# Altium footprint library ATROTECH.PcbLib: 334 footprints (part 10 of 21)
Each footprint in its own frame and in the unit in brackets; x right, y up, seen from the top. Pads: shape width x height; smd on the part's side, far side on the other; paste and mask are expansions set on the pad; w line width, h text height; cw(c..) or ccw(c..) is an arc to the next point about the centre after c.
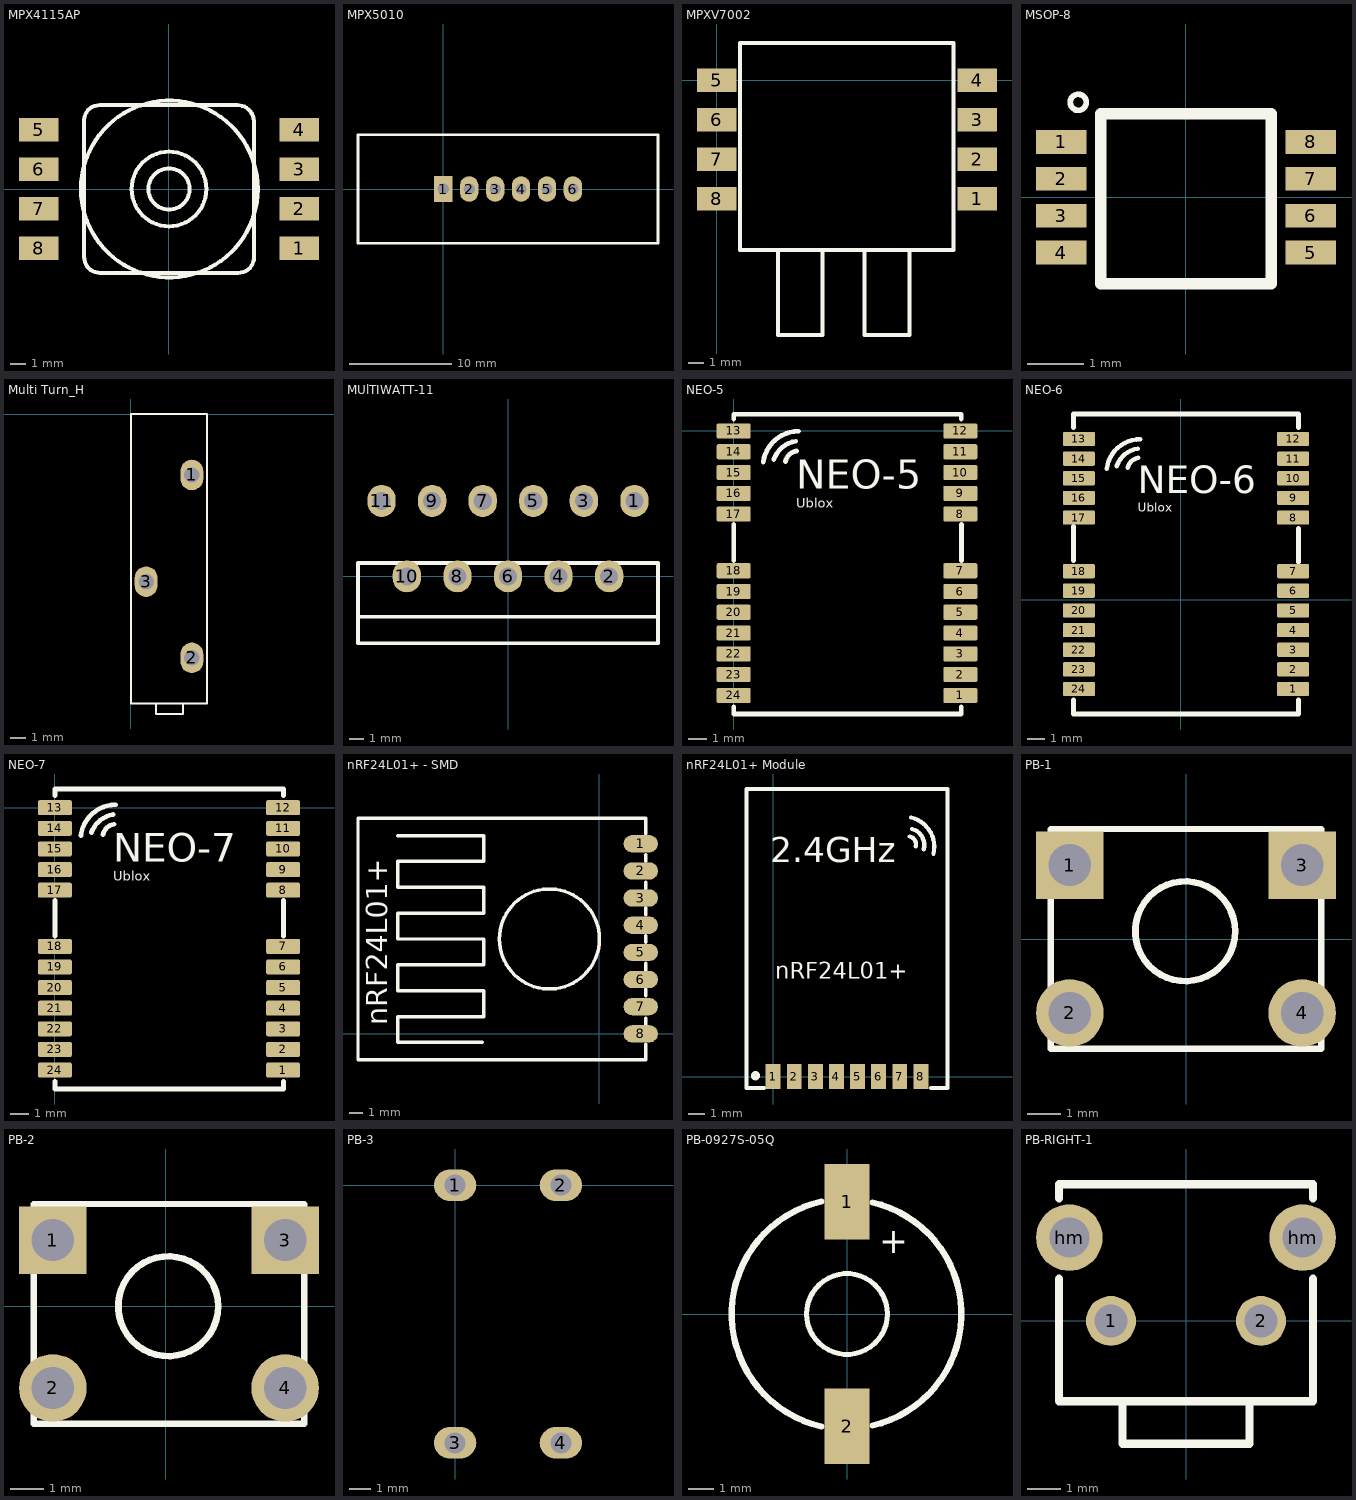
[diagram p9: the footprints below, top view; thin cyan lines are the x and y axes]

## MPX4115AP [mm]
pads (8):
  rect 2.54x1.524 smd: 1(8.38,-3.81) 2(8.38,-1.27) 3(8.38,1.27) 4(8.38,3.81) 5(-8.38,3.81) 6(-8.38,1.27) 7(-8.38,-1.27) 8(-8.38,-3.81)
Top Overlay:
  circle w0.254: c0,0 r1.326
  circle w0.254: c0,0 r2.4
  circle w0.254: c0.025,0 r5.69
  lines w0.254: -4.445,5.395 ccw(c-4.477,4.413) -5.459,4.445 -5.459,-4.381 ccw(c-4.445,-4.381) -4.445,-5.395 4.444,-5.395 ccw(c4.476,-4.413) 5.458,-4.445 ; -4.382,5.395 4.379,5.395 cw(c4.411,4.348) 5.458,4.381 5.458,-4.572

## MPX5010 [mm]
pads (6):
  rect 1.8x2.5 hole 1.1: 1(0,0)
  oval 1.8x2.5 hole 1.1: 2(2.54,0) 3(5.08,0) 4(7.62,0) 5(10.16,0) 6(12.7,0)
Top Overlay:
  lines w0.254: -8.36,-5.3 -8.36,5.3 21.04,5.3 21.04,-5.3 -8.36,-5.3

## MPXV7002 [mm]
pads (8):
  rect 2.54x1.52 smd: 1(16.76,-7.62) 2(16.76,-5.08) 3(16.76,-2.54) 4(16.76,0) 5(0,0) 6(0,-2.54) 7(0,-5.08) 8(0,-7.62)
Top Overlay:
  lines w0.254: 3.937,-10.922 3.937,-16.4 6.8,-16.4 6.8,-10.922 ; 9.5,-10.922 9.5,-16.4 12.4,-16.4 12.4,-10.922 ; 1.5,-10.922 1.5,2.4 15.24,2.4 15.24,1.27 15.24,-10.922 1.5,-10.922
3D body "MPXV7002.step": height 10.41, standoff -0.25, extent -0.522,-16.563 17.322,2.36

## MSOP-8 [mm]
pads (8):
  rect 0.889x0.42 smd: 1(-2.2,0.975) 2(-2.2,0.325) 3(-2.2,-0.325) 4(-2.2,-0.975) 5(2.2,-0.975) 6(2.2,-0.325) 7(2.2,0.325) 8(2.2,0.975)
Top Overlay:
  circle w0.1: c-1.9,1.675 r0.141
  lines w0.203: -1.5,-1.525 -1.5,1.475 1.5,1.475 1.5,-1.525 -1.5,-1.525
3D body "User Library-MSOP-8-1.step": height 0.92, standoff 0, extent -2.5,-1.525 2.5,1.475

## Multi Turn_H [mm]
pads (3):
  oval 1.5x2 hole 1: 1(4,-4) 2(4,-16) 3(1,-11)
Top Overlay:
  lines w0.127: 1.651,-19.05 1.651,-19.685 3.429,-19.685 3.429,-19.05 ; 0,-19 0,0 5,0 5,-19 0,-19

## MUlTIWATT-11 [mil]
height 760
pads (11):
  oval 75x85 hole 48: 1(335,200) 2(268,0) 3(201,200) 4(134,0) 5(67,200) 6(0,0) 7(-67,200) 8(-134,0) 9(-201,200) 10(-268,0) 11(-335,200)
Top Overlay:
  lines w10: -397.5,-117 -397.5,-115 ; -397.5,-107 397.5,-107 ; -397.5,-177.17 -397.5,35 397.5,35 397.5,-177.17 -397.5,-177.17
3D body "User Library-Multiwatt11V.step": height 858.27, standoff -125.98, extent -397.64,-179.14 397.64,210.23

## NEO-5 [mm]
pads (24):
  rrect20% 1.8x0.8 smd: 1(12,-14) 2(12,-12.9) 3(12,-11.8) 4(12,-10.7) 5(12,-9.6) 6(12,-8.5) 7(12,-7.4) 8(12,-4.4) 9(12,-3.3) 10(12,-2.2) 11(12,-1.1) 12(12,0) 13(0,0) 14(0,-1.1) 15(0,-2.2) 16(0,-3.3) 17(0,-4.4) 18(0,-7.4) 19(0,-8.5) 20(0,-9.6) 21(0,-10.7) 22(0,-11.8) 23(0,-12.9) 24(0,-14)
Top Overlay:
  lines w0.254: 0,-14.605 0,-14.986 12.047,-14.986 12.047,-14.605 ; 0,-6.858 0,-4.953 ; 0,0.635 0,0.889 12.047,0.889 12.047,0.635 ; 1.565,-1.656 cw(c3.429,-1.893) 3.429,-0.014 ; 2.127,-1.513 cw(c3.496,-1.972) 3.288,-0.542 ; 2.742,-1.617 cw(c3.427,-1.751) 3.328,-1.06 ; 12.065,-6.858 12.065,-4.953
  text "Ublox" at 3.302,-4.064 h0.5
  text "NEO-5" at 3.302,-3.048 h1.52

## NEO-6 [mm]
pads (24):
  rrect20% 1.8x0.8 smd: 1(6.3,-5) 2(6.3,-3.9) 3(6.3,-2.8) 4(6.3,-1.7) 5(6.3,-0.6) 6(6.3,0.5) 7(6.3,1.6) 8(6.3,4.6) 9(6.3,5.7) 10(6.3,6.8) 11(6.3,7.9) 12(6.3,9) 13(-5.7,9) 14(-5.7,7.9) 15(-5.7,6.8) 16(-5.7,5.7) 17(-5.7,4.6) 18(-5.7,1.6) 19(-5.7,0.5) 20(-5.7,-0.6) 21(-5.7,-1.7) 22(-5.7,-2.8) 23(-5.7,-3.9) 24(-5.7,-5)
Top Overlay:
  lines w0.254: -6,-5.605 -6,-6.4 6.6,-6.4 6.6,-5.605 ; -6,2.195 -6,4.1 ; -6,9.635 -6,10.4 6.6,10.4 6.6,9.635 ; -4.135,7.344 cw(c-2.271,7.107) -2.271,8.986 ; -3.573,7.487 cw(c-2.204,7.028) -2.412,8.458 ; -2.958,7.383 cw(c-2.273,7.249) -2.372,7.94 ; 6.6,2.095 6.6,4
  text "NEO-6" at -2.398,5.952 h1.52
  text "Ublox" at -2.398,4.936 h0.5
3D body "User Library-UBLOX_GPS_NEO-6M.step": height 2.64, standoff 0, extent -5.88,-6.3 6.48,10.3

## NEO-7 [mm]
pads (24):
  rrect20% 1.8x0.8 smd: 1(12.178,-14) 2(12.178,-12.9) 3(12.178,-11.8) 4(12.178,-10.7) 5(12.178,-9.6) 6(12.178,-8.5) 7(12.178,-7.4) 8(12.178,-4.4) 9(12.178,-3.3) 10(12.178,-2.2) 11(12.178,-1.1) 12(12.178,0) 13(0,0) 14(0,-1.1) 15(0,-2.2) 16(0,-3.3) 17(0,-4.4) 18(0,-7.4) 19(0,-8.5) 20(0,-9.6) 21(0,-10.7) 22(0,-11.8) 23(0,-12.9) 24(0,-14)
Top Overlay:
  lines w0.254: 0,-14.605 0,-15.011 12.2,-15.011 12.2,-14.605 ; 0,-6.858 0,-4.953 ; 0,0.635 0,1 12.2,1 12.2,0.635 ; 1.387,-1.478 cw(c3.251,-1.715) 3.251,0.164 ; 1.949,-1.335 cw(c3.319,-1.794) 3.111,-0.364 ; 2.564,-1.439 cw(c3.249,-1.574) 3.15,-0.882 ; 12.2,-6.858 12.2,-4.953
  text "NEO-7" at 3.124,-2.87 h1.52
  text "Ublox" at 3.124,-3.886 h0.5

## nRF24L01+ - SMD [mil]
pads (8):
  oval 100x50 smd: 1(120,551.18) 2(120,472.44) 3(120,393.7) 4(120,314.96) 5(120,236.22) 6(120,157.48) 7(120,78.74) 8(120,0)
Top Overlay:
  circle w10: c-145,275 r145
  lines w10: -585,575 -335,575 -335,500 -585,500 -585,425 -335,425 -335,350 -585,350 -585,275 -335,275 -335,200 -585,200 -585,125 -335,125 -335,50 -585,50 -585,-25 -340,-25 ; 135,-30 135,-75 125,-75 -700,-75 -700,625 135,625 135,580 ; 135,25 135,45 ; 135,110 135,130 ; 135,185 135,205 ; 135,265 135,285 ; 135,345 135,365 ; 135,420 135,440 ; 135,500 135,520
  text "nRF24L01+" at -615,25 h60

## nRF24L01+ Module [mm] "nRF24L01+ Module"
pads (8):
  rect 0.9x1.5 smd: 1(0,0) 2(1.27,0) 3(2.54,0) 4(3.81,0) 5(5.08,0) 6(6.35,0) 7(7.62,0) 8(8.89,0)
Top Overlay:
  circle w0.254: c-1.067,0.051 r0.148
  lines w0.254: -0.559,-0.686 -1.6,-0.686 -1.6,17.314 10.49,17.314 10.49,-0.686 9.5,-0.686 ; 8.23,14.453 cw(c8.115,13.983) 8.585,13.868 ; 8.306,15.596 cw(c7.887,13.83) 9.652,13.411 ; 8.357,14.91 cw(c8.103,13.945) 9.068,13.691
  text "2.4GHz" at -0.178,12.903 h1.52
  text "nRF24L01+" at 0.127,5.893 h1

## PB-1 [mil] "SHORT PUSH BUTTON"
pads (4):
  rect 80x80 hole 50: 1(-137.5,87.5) 3(137.5,87.5)
  round 80 hole 50: 2(-137.5,-87.5) 4(137.5,-87.5)
Top Overlay:
  circle w7.87: c-0.89,9.15 r59.06
  lines w7: -160,130 160,130
  lines w7.87: -160,130 -160,-130 160,-130 160,130
3D body "tactileswitch-short.STEP": height 215, standoff -113, extent -150.4,-117.29 152.4,119.21

## PB-2 [mil]
pads (4):
  rect 80x80 hole 50: 1(-133.5,78.5) 3(141.5,78.5)
  round 80 hole 50: 2(-133.5,-96.5) 4(141.5,-96.5)
Top Overlay:
  circle w7.87: c3.11,0.15 r59.06
  lines w7: -156,121 164,121
  lines w7.87: -156,121 -156,-139 164,-139 164,121
3D body "tactileswitch-long.STEP": height 536, standoff -113, extent -146.4,-126.29 156.4,110.2

## PB-3 [mm] "12mmx12mm"
height 10
pads (4):
  oval 2x1.5 hole 1: 1(0,0) 2(5,0) 3(0,-12.2) 4(5,-12.2)
3D body "Push.STEP": height 11.1, standoff -4.32, extent -3.485,-12.914 8.515,0.722

## PB-0927S-05Q [mm] "magnetic Buzzer"
pads (2):
  rect 1.8x3 smd: 1(0,4.445) 2(0,-4.445)
Top Overlay:
  circle w0.2: c0,0 r1.6
  lines w0.254: -1.019,-4.457 cw(c0,0) -1.019,4.457 ; 1.01,-4.419 ccw(c0,0) 1.01,4.419
  text "+" at 1.27,2.413 h1
3D body: height 5, standoff 0, extent -4.5,-4.499 4.5,4.499

## PB-RIGHT-1 [mm]
pads (4):
  round 1.5 hole 1 paste+0: 1(-2.25,0)
  round 1.5 hole 1: 2(2.25,0)
  round 2 hole 1.2: hm(-3.5,2.5) hm(3.5,2.5)
Top Overlay:
  lines w0.254: -3.81,1.27 -3.81,-2.413 3.81,-2.413 3.81,1.27 ; -3.81,3.683 -3.81,4.1 3.81,4.1 3.81,3.683 ; -1.905,-2.413 -1.905,-3.683 1.905,-3.683 1.905,-2.413
3D body "User Library-SWITCH, TACTILE, RIGHT ANGLE, 12VDC, 50MA, 8_35MM ACTUATOR, WEALTH METAL TC-0240Z.step": height 7, standoff -4, extent -3.7,-8.45 3.7,4.05